# Altium footprint library AmbiqAndromeda.PcbLib: 48 footprints (part 1 of 3)
Each footprint in its own frame and in the unit in brackets; x right, y up, seen from the top. Pads: shape width x height; smd on the part's side, far side on the other; paste and mask are expansions set on the pad; w line width, h text height; cw(c..) or ccw(c..) is an arc to the next point about the centre after c.
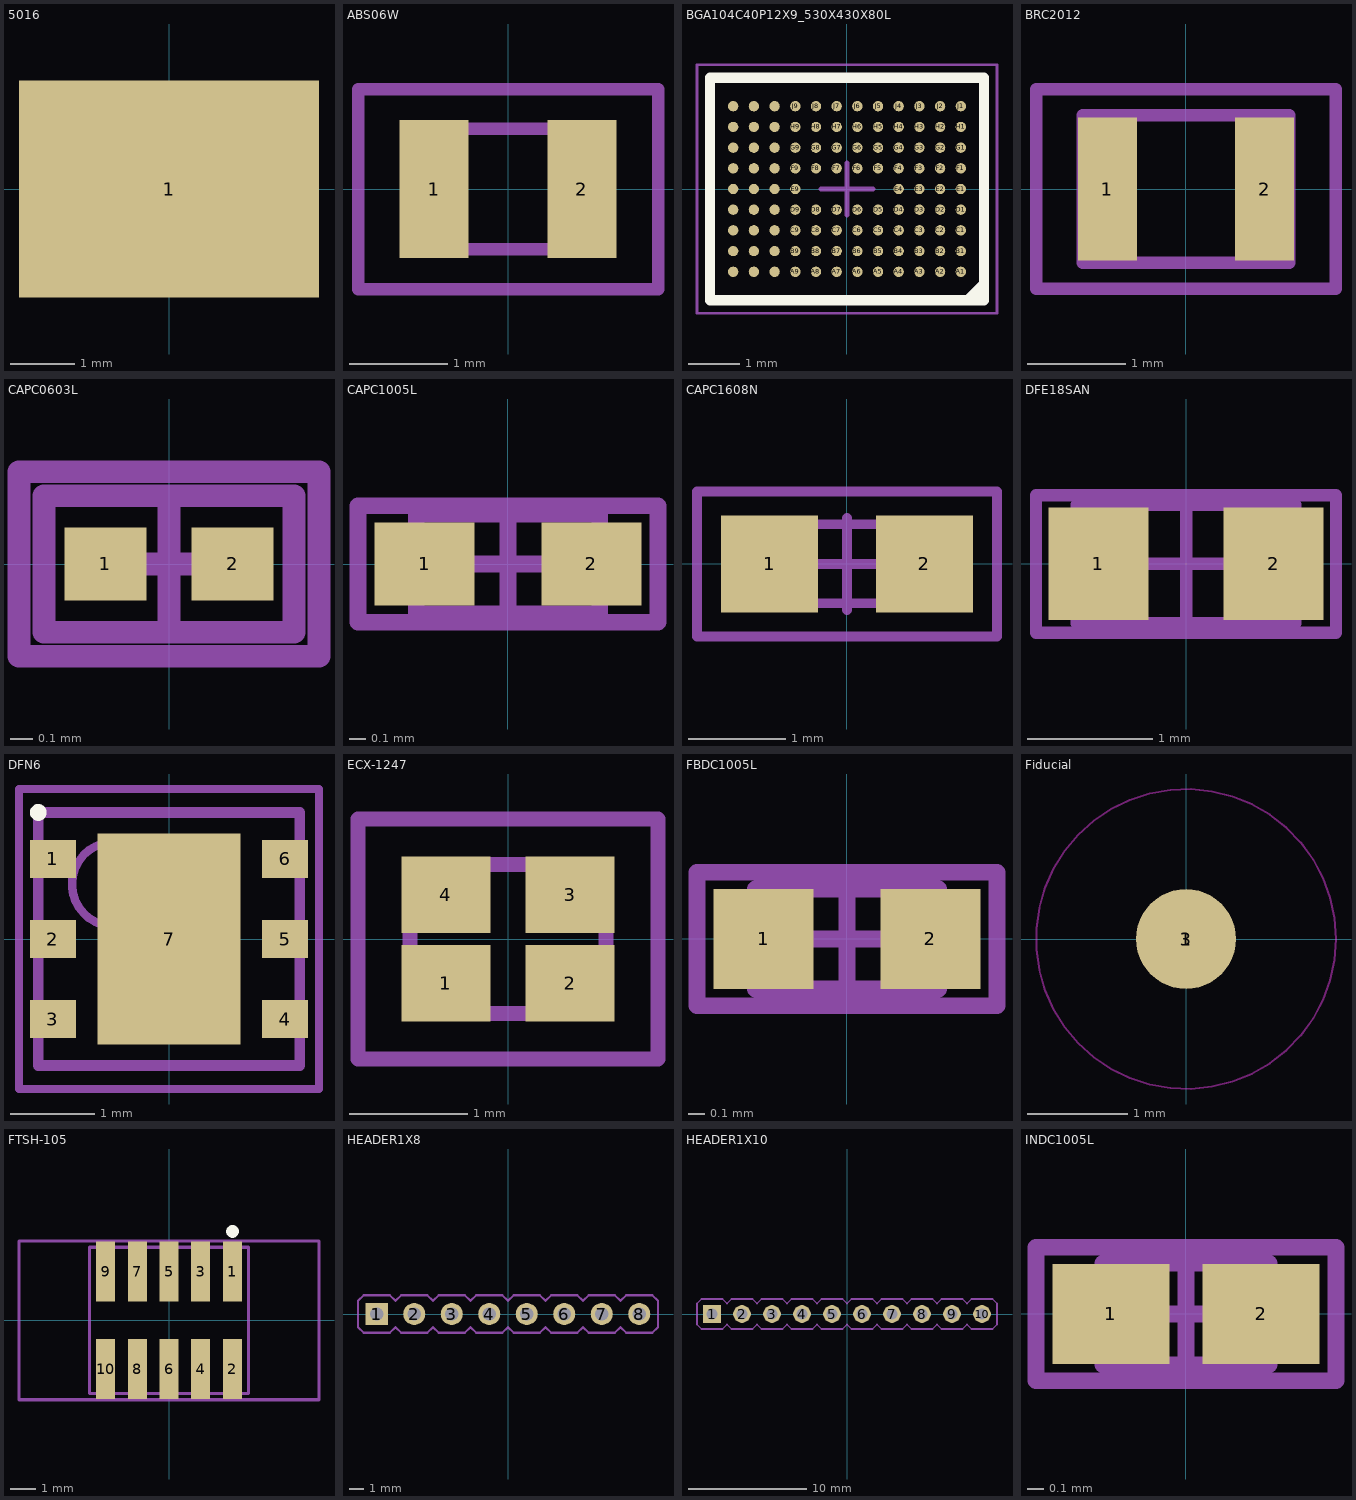
[diagram p0: the footprints below, top view; thin cyan lines are the x and y axes]

## 5016 [mm]
pads (1):
  rect 4.7x3.4 smd: 1(0,0)
3D body "keystone-PN5016.STEP": height 2.3, standoff 0.01, extent -1.922,-1.395 1.888,1.461

## ABS06W [mm]
height 0.6
pads (2):
  rect 0.7x1.4 smd: 1(-0.75,0) 2(0.75,0)
Mechanical 13:
  lines w0.127: -1,-0.61 1,-0.61 1,0.61 -1,0.61 -1,-0.61
Mechanical 15:
  lines w0.127: -1.524,-1.016 1.524,-1.016 1.524,1.016 -1.524,1.016 -1.524,-1.016
3D body "User Library-ABS06.STEP": height 0.6, standoff 0, extent -1,-0.61 1,0.61

## BGA104C40P12X9_530X430X80L [mm] "BGA, 104-Leads, Body 5.30x4.30mmx0.80mm, Pitch 0.40mm"
height 0.8
pads (104):
  round 0.2 smd mask+0.038: A1(2.2,-1.6) A2(1.8,-1.6) A3(1.4,-1.6) A4(1,-1.6) A5(0.6,-1.6) A6(0.2,-1.6) A7(-0.2,-1.6) A8(-0.6,-1.6) A9(-1,-1.6) A10(-1.4,-1.6) A11(-1.8,-1.6) A12(-2.2,-1.6) B1(2.2,-1.2) B2(1.8,-1.2) B3(1.4,-1.2) B4(1,-1.2) B5(0.6,-1.2) B6(0.2,-1.2) B7(-0.2,-1.2) B8(-0.6,-1.2) B9(-1,-1.2) B10(-1.4,-1.2) B11(-1.8,-1.2) B12(-2.2,-1.2) C1(2.2,-0.8) C2(1.8,-0.8) C3(1.4,-0.8) C4(1,-0.8) C5(0.6,-0.8) C6(0.2,-0.8) C7(-0.2,-0.8) C8(-0.6,-0.8) C9(-1,-0.8) C10(-1.4,-0.8) C11(-1.8,-0.8) C12(-2.2,-0.8) D1(2.2,-0.4) D2(1.8,-0.4) D3(1.4,-0.4) D4(1,-0.4) D5(0.6,-0.4) D6(0.2,-0.4) D7(-0.2,-0.4) D8(-0.6,-0.4) D9(-1,-0.4) D10(-1.4,-0.4) D11(-1.8,-0.4) D12(-2.2,-0.4) E1(2.2,0) E2(1.8,0) E3(1.4,0) E4(1,0) E9(-1,0) E10(-1.4,0) E11(-1.8,0) E12(-2.2,0) F1(2.2,0.4) F2(1.8,0.4) F3(1.4,0.4) F4(1,0.4) F5(0.6,0.4) F6(0.2,0.4) F7(-0.2,0.4) F8(-0.6,0.4) F9(-1,0.4) F10(-1.4,0.4) F11(-1.8,0.4) F12(-2.2,0.4) G1(2.2,0.8) G2(1.8,0.8) G3(1.4,0.8) G4(1,0.8) G5(0.6,0.8) G6(0.2,0.8) G7(-0.2,0.8) G8(-0.6,0.8) G9(-1,0.8) G10(-1.4,0.8) G11(-1.8,0.8) G12(-2.2,0.8) H1(2.2,1.2) H2(1.8,1.2) H3(1.4,1.2) H4(1,1.2) H5(0.6,1.2) H6(0.2,1.2) H7(-0.2,1.2) H8(-0.6,1.2) H9(-1,1.2) H10(-1.4,1.2) H11(-1.8,1.2) H12(-2.2,1.2) J1(2.2,1.6) J2(1.8,1.6) J3(1.4,1.6) J4(1,1.6) J5(0.6,1.6) J6(0.2,1.6) J7(-0.2,1.6) J8(-0.6,1.6) J9(-1,1.6) J10(-1.4,1.6) J11(-1.8,1.6) J12(-2.2,1.6)
Top Overlay:
  region: 2.336,-2.15 2.65,-1.836 2.65,-2.15
  lines w0.2: 2.336,-2.15 2.65,-1.836 ; -2.65,-2.15 -2.65,2.15 2.65,2.15 2.65,-2.15 -2.65,-2.15
Mechanical 13:
  lines w0.1: -2.65,-2.15 -2.65,2.15 2.65,2.15 2.65,-2.15 -2.65,-2.15
Mechanical 15:
  lines w0.05: -2.9,-2.4 -2.9,2.4 2.9,2.4 2.9,-2.4 -2.9,-2.4
  lines w0.1: -0.5,0 0.5,0 ; 0,-0.5 0,0.5
3D body "BGA104C40P12X9_530X430X80.step": height 0.8, standoff 0, extent -2.65,-2.15 2.65,2.15

## BRC2012 [mm]
pads (2):
  rect 0.6x1.45 smd: 1(-0.8,0) 2(0.8,0)
Mechanical 13:
  lines w0.127: -1.05,-0.75 -1.05,0.75 1.05,0.75 1.05,-0.75 -1.05,-0.75
Mechanical 15:
  lines w0.127: -1.524,-1.016 -1.524,1.016 1.524,1.016 1.524,-1.016 -1.524,-1.016
3D body "User Library-LQW2BHN.STEP": height 1.7, standoff 0, extent -1.05,-0.75 1.05,0.75

## CAPC0603L [mm] "Chip Capacitor, Body 1.0x0.5mm, IPC High Density"
height 0.35
pads (2):
  rect 0.36x0.32 smd mask+0.102: 1(-0.28,0)
  rect 0.36x0.32 smd: 2(0.28,0)
Mechanical 13:
  lines w0.1: -0.55,-0.3 -0.55,0.3 0.55,0.3 0.55,-0.3 -0.55,-0.3
Mechanical 15:
  lines w0.1: -0.3,0 0.3,0 ; 0,-0.3 0,0.3 ; -0.66,-0.406 -0.66,0.406 0.66,0.406 0.66,-0.406 -0.66,-0.406
3D body "C 0201.STEP": height 0.31, standoff -0.01, extent -0.3,-0.16 0.3,0.16

## CAPC1005L [mm] "Chip Capacitor, Body 1.0x0.5mm, IPC High Density"
height 0.6
pads (2):
  rect 0.6x0.5 smd: 1(-0.5,0) 2(0.5,0)
Mechanical 13:
  lines w0.1: -0.55,-0.3 -0.55,0.3 0.55,0.3 0.55,-0.3 -0.55,-0.3
Mechanical 15:
  lines w0.1: -0.3,0 0.3,0 ; 0,-0.3 0,0.3 ; -0.9,-0.35 -0.9,0.35 0.9,0.35 0.9,-0.35 -0.9,-0.35
3D body "C 0402.STEP": height 0.51, standoff -0.01, extent -0.5,-0.26 0.5,0.26

## CAPC1608N [mm] "Chip Capacitor, Body 1.6x0.8mm, IPC Medium Density"
height 0.85
pads (2):
  rect 1x1 smd: 1(-0.8,0) 2(0.8,0)
Mechanical 13:
  lines w0.1: -0.8,-0.406 -0.8,0.41 0.813,0.41 0.813,-0.406 -0.8,-0.406
Mechanical 15:
  lines w0.1: -0.475,0 0.475,0 ; 0,-0.475 0,0.475 ; -1.55,-0.75 -1.55,0.75 1.55,0.75 1.55,-0.75 -1.55,-0.75
3D body "C 0603.STEP": height 0.81, standoff -0.01, extent -0.8,-0.41 0.8,0.41

## DFE18SAN [mm]
pads (2):
  rect 0.8x0.9 smd: 1(-0.7,0) 2(0.7,0)
Mechanical 13:
  lines w0.1: -0.875,-0.475 0.875,-0.475 0.875,0.475 -0.875,0.475 -0.875,-0.475
Mechanical 15:
  lines w0.1: -0.475,0 0.475,0 ; 0,-0.475 0,0.475 ; -1.2,-0.55 1.2,-0.55 1.2,0.55 -1.2,0.55 -1.2,-0.55
3D body "0603.STEP": height 0.8, standoff 0, extent -0.8,-0.4 0.8,0.4

## DFN6 [mm] "3x3"
height 0.95
pads (7):
  rect 0.55x0.45 smd: 1(-1.375,0.95) 2(-1.375,0) 3(-1.375,-0.95) 4(1.375,-0.95) 5(1.375,0) 6(1.375,0.95)
  rect 1.7x2.5 smd: 7(0,0)
Top Overlay:
  circle w0.1: c-1.55,1.5 r0.05
Mechanical 13:
  lines w0.127: -1.55,-1.5 -1.55,1.5 1.55,1.5 1.55,-1.5 1.375,-1.5 -1.55,-1.5
Mechanical 15:
  circle w0.1: c-0.65,0.65 r0.5
  lines w0.1: -1.778,-1.778 -1.778,1.778 1.778,1.778 1.778,-1.778 -1.778,-1.778
3D body "User Library-dfn6_3x3_rm0_95.STEP": height 0.8, standoff 0, extent -1.55,-1.5 1.55,1.5

## ECX-1247 [mm]
height 0.71
pads (4):
  rect 0.75x0.65 smd: 1(-0.525,-0.375) 2(0.525,-0.375) 3(0.525,0.375) 4(-0.525,0.375)
Mechanical 13:
  lines w0.127: -0.83,-0.629 0.83,-0.629 0.83,0.63 -0.83,0.63 -0.83,-0.629
Mechanical 15:
  lines w0.127: -1.27,-1.016 -1.27,1.016 1.27,1.016 1.27,-1.016 -1.27,-1.016
3D body "User Library-NX1612SA.STEP": height 0.3, standoff 0, extent -0.8,-0.6 0.8,0.6

## FBDC1005L [mm] "Ferrite Bead, Body 1.1x0.5mm, IPC High Density"
height 0.4
pads (2):
  rect 0.6x0.6 smd: 1(-0.5,0) 2(0.5,0)
Mechanical 13:
  lines w0.1: -0.55,-0.3 -0.55,0.3 0.55,0.3 0.55,-0.3 -0.55,-0.3
Mechanical 15:
  lines w0.1: -0.3,0 0.3,0 ; 0,-0.3 0,0.3 ; -0.9,-0.4 -0.9,0.4 0.9,0.4 0.9,-0.4 -0.9,-0.4
3D body "User Library-FB_1005.STEP": height 0.5, standoff 0, extent -0.5,-0.25 0.5,0.25

## Fiducial [mm]
pads (2):
  round 1 smd: 1(0,0)
  round 3 on Top Solder: 3(0,0)
Top Layer keep-out:
  circle w0.02: c0,0 r1.5

## FTSH-105 [mm]
height 0.71
pads (10):
  rect 0.76x2.4 smd: 1(2.54,1.95) 2(2.54,-1.95) 3(1.27,1.95) 4(1.27,-1.95) 5(0,1.95) 6(0,-1.95) 7(-1.27,1.95) 8(-1.27,-1.95) 9(-2.54,1.95) 10(-2.54,-1.95)
Top Overlay:
  circle w0.254: c2.54,3.556 r0.127
Mechanical 13:
  lines w0.127: -3.175,-2.921 -3.175,2.921 3.175,2.921 3.175,-2.921 -3.175,-2.921
Mechanical 15:
  lines w0.127: -6,-3.175 -6,-2.921 -6,3.175 6,3.175 6,-3.175 -6,-3.175
3D body "FTSH-105-01-L-DV-K-TR.stp": height 6.11, standoff -0.01, extent -3.175,-2.921 3.175,2.921

## HEADER1X8 [mm]
pads (8):
  rect 1.5x1.5 hole 0.9: 1(-8.89,0)
  round 1.5 hole 0.9: 2(-6.35,0) 3(-3.81,0) 4(-1.27,0) 5(1.27,0) 6(3.81,0) 7(6.35,0) 8(8.89,0)
Mechanical 13:
  lines w0.152: -6.985,1.27 -5.715,1.27 ; 0.635,1.27 1.905,1.27 ; 8.255,1.27 9.525,1.27 ; -10.16,-0.889 -9.779,-1.27 -8.001,-1.27 -7.62,-0.889 -7.239,-1.27 -5.461,-1.27 -5.08,-0.889 -4.699,-1.27 -2.921,-1.27 -2.54,-0.889 -2.159,-1.27 -0.381,-1.27 0,-0.889 0.381,-1.27 2.159,-1.27 2.54,-0.889 2.921,-1.27 4.699,-1.27 5.08,-0.889 5.461,-1.27 7.239,-1.27 7.62,-0.889 8.001,-1.27 9.779,-1.27 10.16,-0.889 10.16,0.889 9.779,1.27 8.001,1.27 7.62,0.889 7.239,1.27 5.461,1.27 5.08,0.889 4.699,1.27 2.921,1.27 2.54,0.889 2.159,1.27 0.381,1.27 0,0.889 -0.381,1.27 -2.159,1.27 -2.54,0.889 -2.921,1.27 -4.699,1.27 -5.08,0.889 -5.461,1.27 -7.239,1.27 -7.62,0.889 -8.001,1.27 -9.779,1.27 -10.16,0.889 -10.16,-0.889
3D body "1001-8.STEP": height 8.54, standoff -3, extent -10.16,-1.27 10.16,1.27

## HEADER1X10 [mm]
pads (10):
  rect 1.5x1.5 hole 0.9: 1(-11.43,0)
  round 1.5 hole 0.9: 2(-8.89,0) 3(-6.35,0) 4(-3.81,0) 5(-1.27,0) 6(1.27,0) 7(3.81,0) 8(6.35,0) 9(8.89,0) 10(11.43,0)
Mechanical 13:
  lines w0.152: -9.525,1.27 -8.255,1.27 ; -1.905,1.27 -0.635,1.27 ; 5.715,1.27 6.985,1.27 ; -12.7,-0.889 -12.7,0.889 -12.319,1.27 -10.541,1.27 -10.16,0.889 -9.779,1.27 -8.001,1.27 -7.62,0.889 -7.239,1.27 -5.461,1.27 -5.08,0.889 -4.699,1.27 -2.921,1.27 -2.54,0.889 -2.159,1.27 -0.381,1.27 0,0.889 0.381,1.27 2.159,1.27 2.54,0.889 2.921,1.27 4.699,1.27 5.08,0.889 5.461,1.27 7.239,1.27 7.62,0.889 8.001,1.27 9.779,1.27 10.16,0.889 10.541,1.27 12.319,1.27 12.7,0.889 12.7,-0.889 12.319,-1.27 10.541,-1.27 10.16,-0.889 9.779,-1.27 8.001,-1.27 7.62,-0.889 7.239,-1.27 5.461,-1.27 5.08,-0.889 4.699,-1.27 2.921,-1.27 2.54,-0.889 2.159,-1.27 0.381,-1.27 0,-0.889 -0.381,-1.27 -2.159,-1.27 -2.54,-0.889 -2.921,-1.27 -4.699,-1.27 -5.08,-0.889 -5.461,-1.27 -7.239,-1.27 -7.62,-0.889 -8.001,-1.27 -9.779,-1.27 -10.16,-0.889 -10.541,-1.27 -12.319,-1.27 -12.7,-0.889
3D body "HDR1x10.STEP": height 8.54, standoff -3, extent -12.7,-1.27 12.7,1.27

## INDC1005L [mm] "Chip Inductor, Body 1.0x0.5mm, IPC High Density"
height 0.6
pads (2):
  rect 0.7x0.6 smd: 1(-0.45,0) 2(0.45,0)
Mechanical 13:
  lines w0.1: -0.5,-0.305 -0.5,0.305 0.5,0.305 0.5,-0.305 -0.5,-0.305
Mechanical 15:
  lines w0.1: -0.35,0 0.35,0 ; 0,-0.35 0,0.35 ; -0.9,-0.4 -0.9,0.4 0.9,0.4 0.9,-0.4 -0.9,-0.4
3D body "User Library-Chip InductorINDC1005X60N.STEP": height 0.5, standoff 0, extent -0.5,-0.298 0.5,0.302